# Altium footprint library THU.PcbLib: 477 footprints (part 23 of 30)
Each footprint in its own frame and in the unit in brackets; x right, y up, seen from the top. Pads: shape width x height; smd on the part's side, far side on the other; paste and mask are expansions set on the pad; w line width, h text height; cw(c..) or ccw(c..) is an arc to the next point about the centre after c.
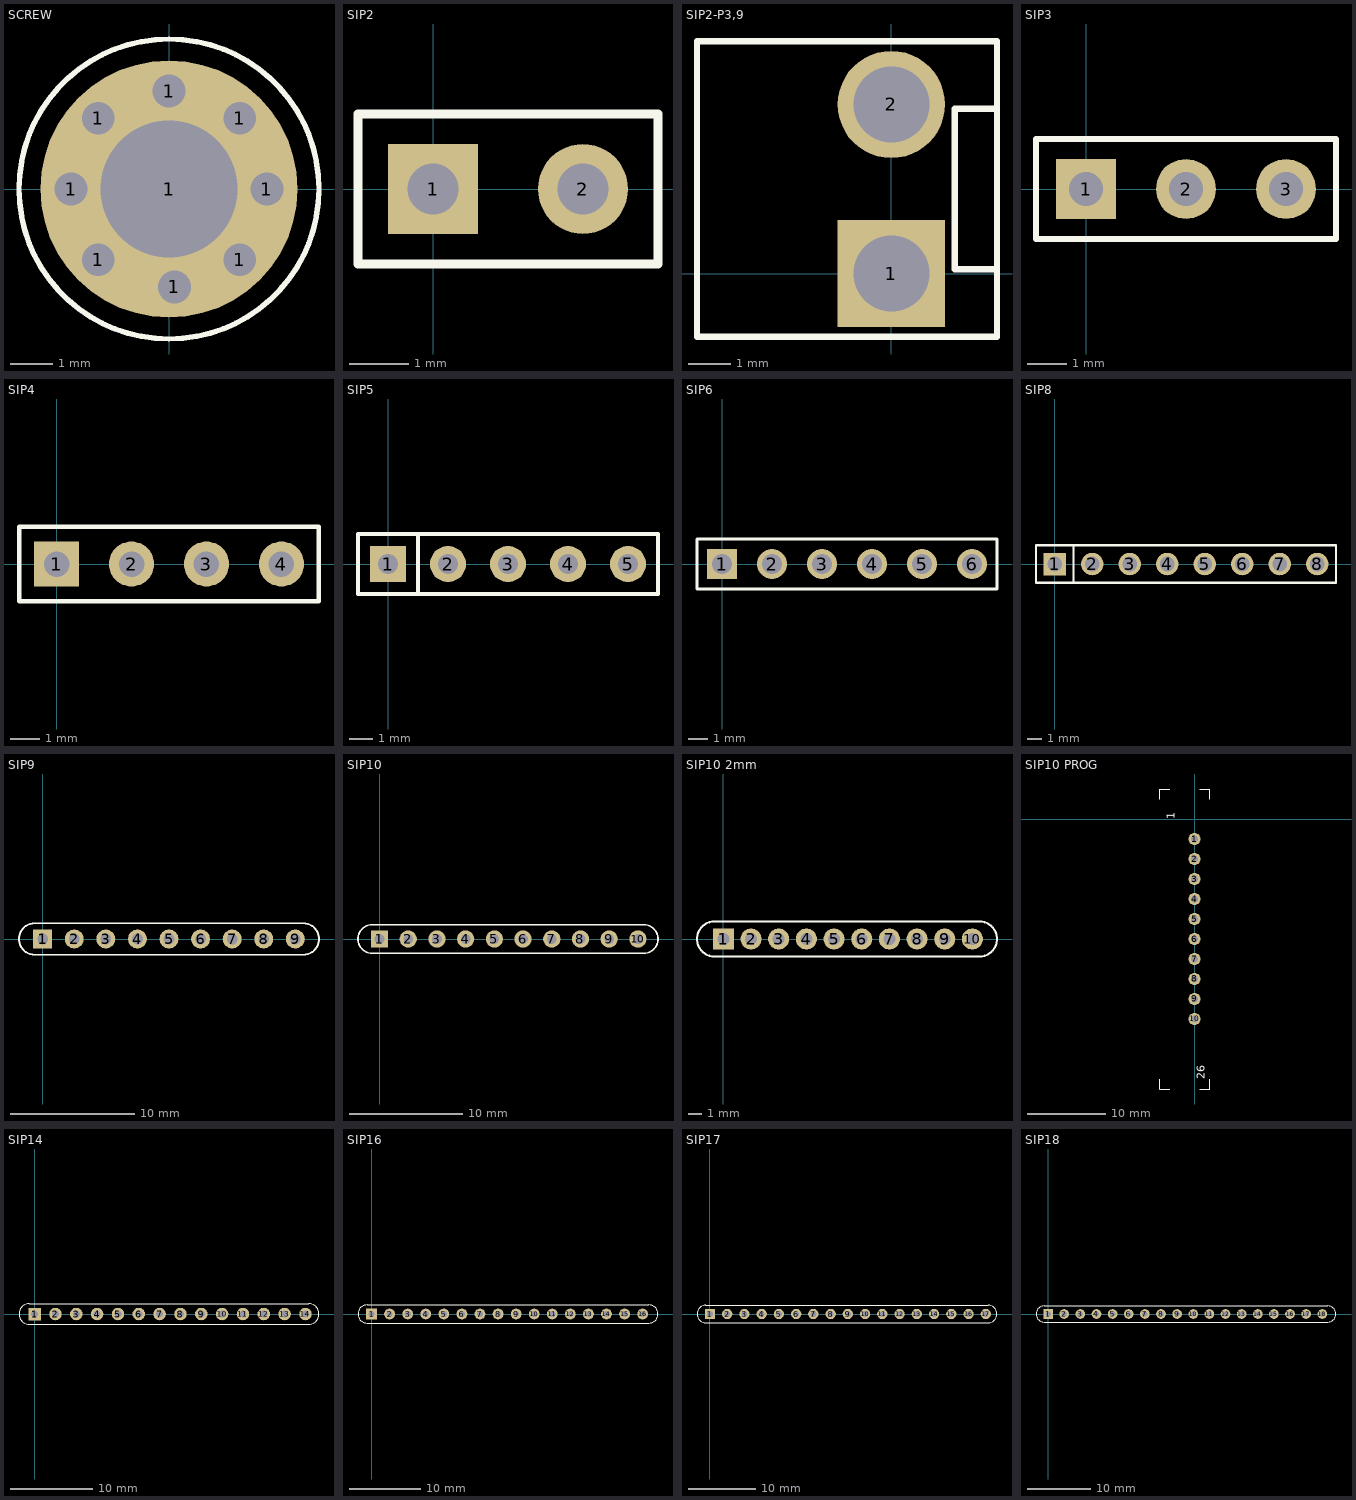
[diagram p22: the footprints below, top view; thin cyan lines are the x and y axes]

## SCREW [mil]
pads (9):
  round 40 hole 30: 1(-90,0) 1(-65,-65) 1(-65,65) 1(0,90) 1(5,-90) 1(65,-65) 1(65,65) 1(90,0)
  round 236.22 hole 125.98: 1(0,0)
TopOverlay:
  circle w5: c0,0 r137.8

## SIP2 [mil]
pads (2):
  rect 60x60 hole 34: 1(0,0)
  round 60 hole 34: 2(100,0)
TopOverlay:
  lines w6: -50,-50 150,-50 150,50 -50,50 -50,-50

## SIP2-P3,9 [mm]
pads (2):
  rect 2.54x2.54 hole 1.8: 1(0,0)
  round 2.54 hole 1.8: 2(0,4)
TopOverlay:
  lines w0.152: 2.5,0.1 1.5,0.1 1.5,3.9 2.5,3.9 ; -4.6,-1.5 -4.6,5.5 2.5,5.5 2.5,-1.5 -4.6,-1.5

## SIP3 [mil]
pads (3):
  rect 60x60 hole 34: 1(0,0)
  round 60 hole 34: 2(100,0) 3(200,0)
TopOverlay:
  lines w6: -50,-50 250,-50 250,50 -50,50 -50,-50
3D body: height 98.43, standoff 0, extent -50,-50 250,50
3D body: height 354.33, standoff -118.11, extent -11,-11 11,11
3D body: height 354.33, standoff -118.11, extent 89,-11 111,11
3D body: height 354.33, standoff -118.11, extent 189,-11 211,11

## SIP4 [mil]
pads (4):
  rect 60x60 hole 34: 1(0,0)
  round 60 hole 34: 2(100,0) 3(200,0) 4(300,0)
TopOverlay:
  lines w6: -50,-50 -50,0 -50,50 350,50 350,-50 -50,-50

## SIP5 [mil]
pads (5):
  rect 60x60 hole 34: 1(0,0)
  round 60 hole 34: 2(100,0) 3(200,0) 4(300,0) 5(400,0)
TopOverlay:
  lines w6: 50,-50 50,50 ; -50,-50 450,-50 450,50 -50,50 -50,0 -50,-50

## SIP6 [mil]
pads (6):
  rect 60x60 hole 39.37: 1(0,0)
  round 60 hole 39.37: 2(100,0) 3(200,0) 4(300,0) 5(400,0) 6(500,0)
TopOverlay:
  lines w6: -50,-50 550,-50 550,50 -50,50 -50,-50

## SIP8 [mil]
pads (8):
  rect 60x60 hole 39.37: 1(0,0)
  round 60 hole 39.37: 2(100,0) 3(200,0) 4(300,0) 5(400,0) 6(500,0) 7(600,0) 8(700,0)
TopOverlay:
  lines w6: 50,-50 50,50 ; -50,-50 -50,50 750,50 750,-50 -50,-50

## SIP9 [mil]
pads (9):
  rect 60x60 hole 34: 1(0,0)
  round 60 hole 34: 2(100,0) 3(200,0) 4(300,0) 5(400,0) 6(500,0) 7(600,0) 8(700,0) 9(800,0)
TopOverlay:
  lines w6: -25,-50 cw(c-25,0) -25,50 825,50 cw(c825,0) 825,-50 -25,-50

## SIP10 [mil]
pads (10):
  rect 60x60 hole 34: 1(0,0)
  round 60 hole 34: 2(100,0) 3(200,0) 4(300,0) 5(400,0) 6(500,0) 7(600,0) 8(700,0) 9(800,0) 10(900,0)
TopOverlay:
  lines w6: -25,-50 cw(c-25,0) -25,50 920,50 cw(c920,0) 920,-50 -25,-50

## SIP10 2mm [mil]
pads (10):
  rect 60x60 hole 34: 1(0,0)
  round 60 hole 34: 2(78.74,0) 3(157.48,0) 4(236.22,0) 5(314.96,0) 6(393.7,0) 7(472.44,0) 8(551.18,0) 9(629.92,0) 10(708.66,0)
TopOverlay:
  lines w6: -25,-50 cw(c-25,0) -25,50 728.66,50 cw(c728.66,0) 728.66,-50 -25,-50

## SIP10 PROG [mil]
pads (10):
  round 60 hole 34: 1(0,-100) 2(0,-200) 3(0,-300) 4(0,-400) 5(0,-500) 6(0,-600) 7(0,-700) 8(0,-800) 9(0,-900) 10(0,-1000)
TopOverlay:
  lines w6: -175,-1300 -175,-1350 -125,-1350 ; -175,100 -175,150 -125,150 ; 25,-1350 75,-1350 75,-1300 ; 25,150 75,150 75,100
  text "1" at -100,0 h40
  text "26" at 50,-1300 h40

## SIP14 [mil]
pads (14):
  rect 60x60 hole 34: 1(0,0)
  round 60 hole 34: 2(100,0) 3(200,0) 4(300,0) 5(400,0) 6(500,0) 7(600,0) 8(700,0) 9(800,0) 10(900,0) 11(1000,0) 12(1100,0) 13(1200,0) 14(1300,0)
TopOverlay:
  lines w6: -25,-50 cw(c-25,0) -25,50 1315,50 cw(c1315,0) 1315,-50 -25,-50

## SIP16 [mil]
pads (16):
  rect 60x60 hole 34: 1(0,0)
  round 60 hole 34: 2(100,0) 3(200,0) 4(300,0) 5(400,0) 6(500,0) 7(600,0) 8(700,0) 9(800,0) 10(900,0) 11(1000,0) 12(1100,0) 13(1200,0) 14(1300,0) 15(1400,0) 16(1500,0)
TopOverlay:
  lines w6: -25,-50 cw(c-25,0) -25,50 1535,50 cw(c1535,0) 1535,-50 -25,-50

## SIP17 [mil]
pads (17):
  rect 60x60 hole 34: 1(0,0)
  round 60 hole 34: 2(100,0) 3(200,0) 4(300,0) 5(400,0) 6(500,0) 7(600,0) 8(700,0) 9(800,0) 10(900,0) 11(1000,0) 12(1100,0) 13(1200,0) 14(1300,0) 15(1400,0) 16(1500,0) 17(1600,0)
TopOverlay:
  lines w6: -25,-50 cw(c-25,0) -25,50 1615,50 cw(c1615,0) 1615,-50 -25,-50

## SIP18 [mil]
pads (18):
  rect 60x60 hole 34: 1(0,0)
  round 60 hole 34: 2(100,0) 3(200,0) 4(300,0) 5(400,0) 6(500,0) 7(600,0) 8(700,0) 9(800,0) 10(900,0) 11(1000,0) 12(1100,0) 13(1200,0) 14(1300,0) 15(1400,0) 16(1500,0) 17(1600,0) 18(1700,0)
TopOverlay:
  lines w6: -25,-50 cw(c-25,0) -25,50 1735,50 cw(c1735,0) 1735,-50 -25,-50